# Altium footprint library ref-packages-longpad.PCBLIB: 1527 footprints (part 103 of 103)
Each footprint in its own frame and in the unit in brackets; x right, y up, seen from the top. Pads: shape width x height; smd on the part's side, far side on the other; paste and mask are expansions set on the pad; w line width, h text height; cw(c..) or ccw(c..) is an arc to the next point about the centre after c.
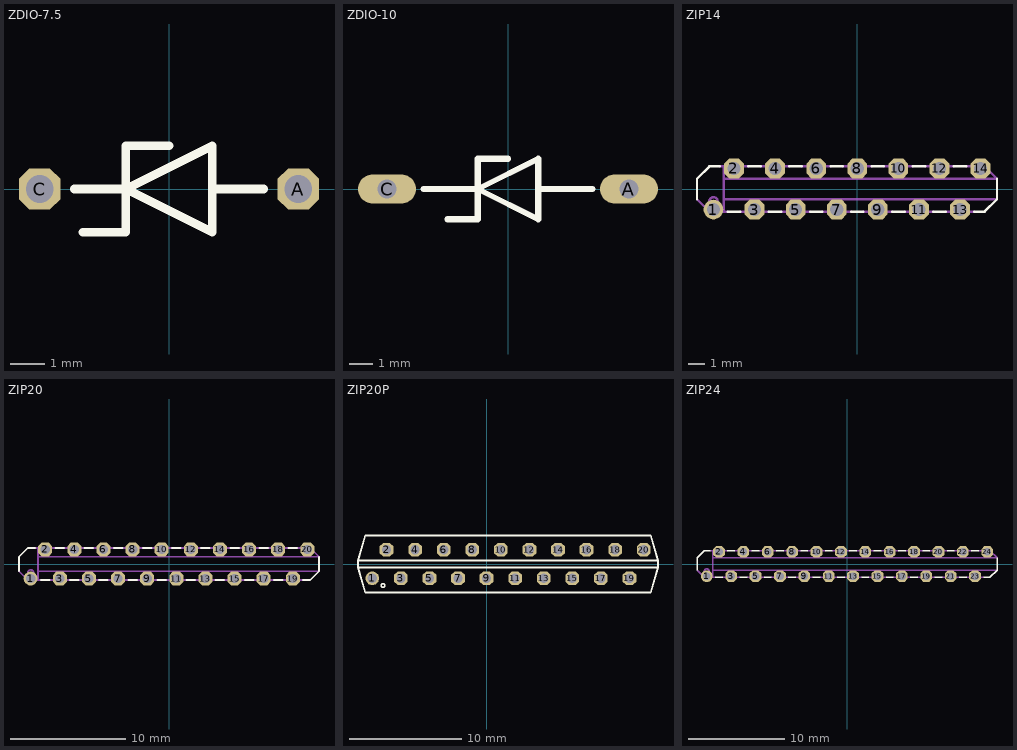
[diagram p102: the footprints below, top view; thin cyan lines are the x and y axes]

## ZDIO-7.5 [mil]
pads (2):
  oct 48x48 hole 32: A(150,0) C(-150,0)
Top Overlay:
  lines w10: -110,0 -50,0 ; -100,-50 -50,-50 -50,0 ; 0,50 -50,50 -50,0 ; 110,0 50,0 ; -50,0 50,50 50,0 ; -50,0 50,-50 50,0

## ZDIO-10 [mil]
pads (2):
  oval 96x48 hole 32: A(200,0) C(-200,0)
Top Overlay:
  lines w10: -140,0 -50,0 ; -100,-50 -50,-50 -50,0 ; 0,50 -50,50 -50,0 ; 140,0 50,0 ; -50,0 50,50 50,0 ; -50,0 50,-50 50,0

## ZIP14 [mil]
pads (14):
  round 48 hole 32: 1(-350,-50)
  oct 48x48 hole 32: 2(-300,50) 3(-250,-50) 4(-200,50) 5(-150,-50) 6(-100,50) 7(-50,-50) 8(0,50) 9(50,-50) 10(100,50) 11(150,-50) 12(200,50) 13(250,-50) 14(300,50)
Top Overlay:
  lines w6: -390,-25 -390,25 -360,55 -335,55 ; -315,-55 -285,-55 ; -265,55 -235,55 ; -215,-55 -185,-55 ; -165,55 -135,55 ; -115,-55 -85,-55 ; -65,55 -35,55 ; -15,-55 15,-55 ; 35,55 65,55 ; 85,-55 115,-55 ; 135,55 165,55 ; 185,-55 215,-55 ; 235,55 265,55 ; 285,-55 310,-55 340,-25 340,25
Mechanical 16:
  circle w6: c-350,-30 r10
  lines w6: -390,-25 -360,-55 -325,-55 ; -335,55 -325,55 ; -315,-55 -325,-55 ; -285,-55 -215,-55 ; -265,55 -325,55 ; -235,55 -165,55 ; -185,-55 -115,-55 ; -135,55 -65,55 ; -85,-55 -15,-55 ; -35,55 35,55 ; 15,-55 85,-55 ; 65,55 135,55 ; 115,-55 185,-55 ; 165,55 235,55 ; 215,-55 285,-55 ; 265,55 310,55 340,25 -325,25 ; 340,-25 -325,-25 ; -325,-55 -325,-25 ; -325,-25 -325,25 ; -325,25 -325,55

## ZIP20 [mil]
pads (20):
  round 48 hole 32: 1(-475,-50)
  oct 48x48 hole 32: 2(-425,50) 3(-375,-50) 4(-325,50) 5(-275,-50) 6(-225,50) 7(-175,-50) 8(-125,50) 9(-75,-50) 10(-25,50) 11(25,-50) 12(75,50) 13(125,-50) 14(175,50) 15(225,-50) 16(275,50) 17(325,-50) 18(375,50) 19(425,-50) 20(475,50)
Top Overlay:
  lines w6: -515,-25 -515,25 -485,55 -460,55 ; -440,-55 -410,-55 ; -390,55 -360,55 ; -340,-55 -310,-55 ; -290,55 -260,55 ; -240,-55 -210,-55 ; -190,55 -160,55 ; -140,-55 -110,-55 ; -90,55 -60,55 ; -40,-55 -10,-55 ; 10,55 40,55 ; 60,-55 90,-55 ; 110,55 140,55 ; 160,-55 190,-55 ; 210,55 240,55 ; 260,-55 290,-55 ; 310,55 340,55 ; 360,-55 390,-55 ; 410,55 440,55 ; 460,-55 485,-55 515,-25 515,25
Mechanical 16:
  circle w6: c-475,-30 r10
  lines w6: -515,-25 -485,-55 -450,-55 ; -460,55 -450,55 ; -440,-55 -450,-55 ; -410,-55 -340,-55 ; -390,55 -450,55 ; -360,55 -290,55 ; -310,-55 -240,-55 ; -260,55 -190,55 ; -210,-55 -140,-55 ; -160,55 -90,55 ; -110,-55 -40,-55 ; -60,55 10,55 ; -10,-55 60,-55 ; 40,55 110,55 ; 90,-55 160,-55 ; 140,55 210,55 ; 190,-55 260,-55 ; 240,55 310,55 ; 290,-55 360,-55 ; 340,55 410,55 ; 390,-55 460,-55 ; 440,55 485,55 515,25 -450,25 ; 515,-25 -450,-25 ; -450,-55 -450,-25 ; -450,-25 -450,25 ; -450,25 -450,55

## ZIP20P [mil]
pads (20):
  round 48 hole 32: 1(-400,-50)
  oct 48x48 hole 32: 2(-350,50) 3(-300,-50) 4(-250,50) 5(-200,-50) 6(-150,50) 7(-100,-50) 8(-50,50) 9(0,-50) 10(50,50) 11(100,-50) 12(150,50) 13(200,-50) 14(250,50) 15(300,-50) 16(350,50) 17(400,-50) 18(450,50) 19(500,-50) 20(550,50)
Top Overlay:
  circle w6: c-362.5,-75 r6.25
  lines w6: 600,0 600,12.5 ; -450,-12.5 -425,-100 575,-100 600,-12.5 ; -450,-12.5 -450,12.5 ; -450,-12.5 600,-12.5 ; -450,12.5 -425,100 575,100 600,12.5 ; -450,12.5 600,12.5 ; 600,-12.5 600,12.5

## ZIP24 [mil]
pads (24):
  round 48 hole 32: 1(-575,-50)
  oct 48x48 hole 32: 2(-525,50) 3(-475,-50) 4(-425,50) 5(-375,-50) 6(-325,50) 7(-275,-50) 8(-225,50) 9(-175,-50) 10(-125,50) 11(-75,-50) 12(-25,50) 13(25,-50) 14(75,50) 15(125,-50) 16(175,50) 17(225,-50) 18(275,50) 19(325,-50) 20(375,50) 21(425,-50) 22(475,50) 23(525,-50) 24(575,50)
Top Overlay:
  lines w6: -615,-25 -615,25 -585,55 -560,55 ; -540,-55 -510,-55 ; -490,55 -460,55 ; -440,-55 -410,-55 ; -390,55 -360,55 ; -340,-55 -310,-55 ; -290,55 -260,55 ; -240,-55 -210,-55 ; -190,55 -160,55 ; -140,-55 -110,-55 ; -90,55 -60,55 ; -40,-55 -10,-55 ; 10,55 40,55 ; 60,-55 90,-55 ; 110,55 140,55 ; 160,-55 190,-55 ; 210,55 240,55 ; 260,-55 290,-55 ; 310,55 340,55 ; 360,-55 390,-55 ; 410,55 440,55 ; 460,-55 490,-55 ; 510,55 540,55 ; 560,-55 585,-55 615,-25 615,25
Mechanical 16:
  circle w6: c-575,-30 r10
  lines w6: -615,-25 -585,-55 -550,-55 ; -560,55 -550,55 ; -540,-55 -550,-55 ; -510,-55 -440,-55 ; -490,55 -550,55 ; -460,55 -390,55 ; -410,-55 -340,-55 ; -360,55 -290,55 ; -310,-55 -240,-55 ; -260,55 -190,55 ; -210,-55 -140,-55 ; -160,55 -90,55 ; -110,-55 -40,-55 ; -60,55 10,55 ; -10,-55 60,-55 ; 40,55 110,55 ; 90,-55 160,-55 ; 140,55 210,55 ; 190,-55 260,-55 ; 240,55 310,55 ; 290,-55 360,-55 ; 340,55 410,55 ; 390,-55 460,-55 ; 440,55 510,55 ; 490,-55 560,-55 ; 540,55 585,55 615,25 -550,25 ; 615,-25 -550,-25 ; -550,-55 -550,-25 ; -550,-25 -550,25 ; -550,25 -550,55